# Altium footprint library ref-packages-longpad.PCBLIB: 1527 footprints (part 68 of 103)
Each footprint in its own frame and in the unit in brackets; x right, y up, seen from the top. Pads: shape width x height; smd on the part's side, far side on the other; paste and mask are expansions set on the pad; w line width, h text height; cw(c..) or ccw(c..) is an arc to the next point about the centre after c.
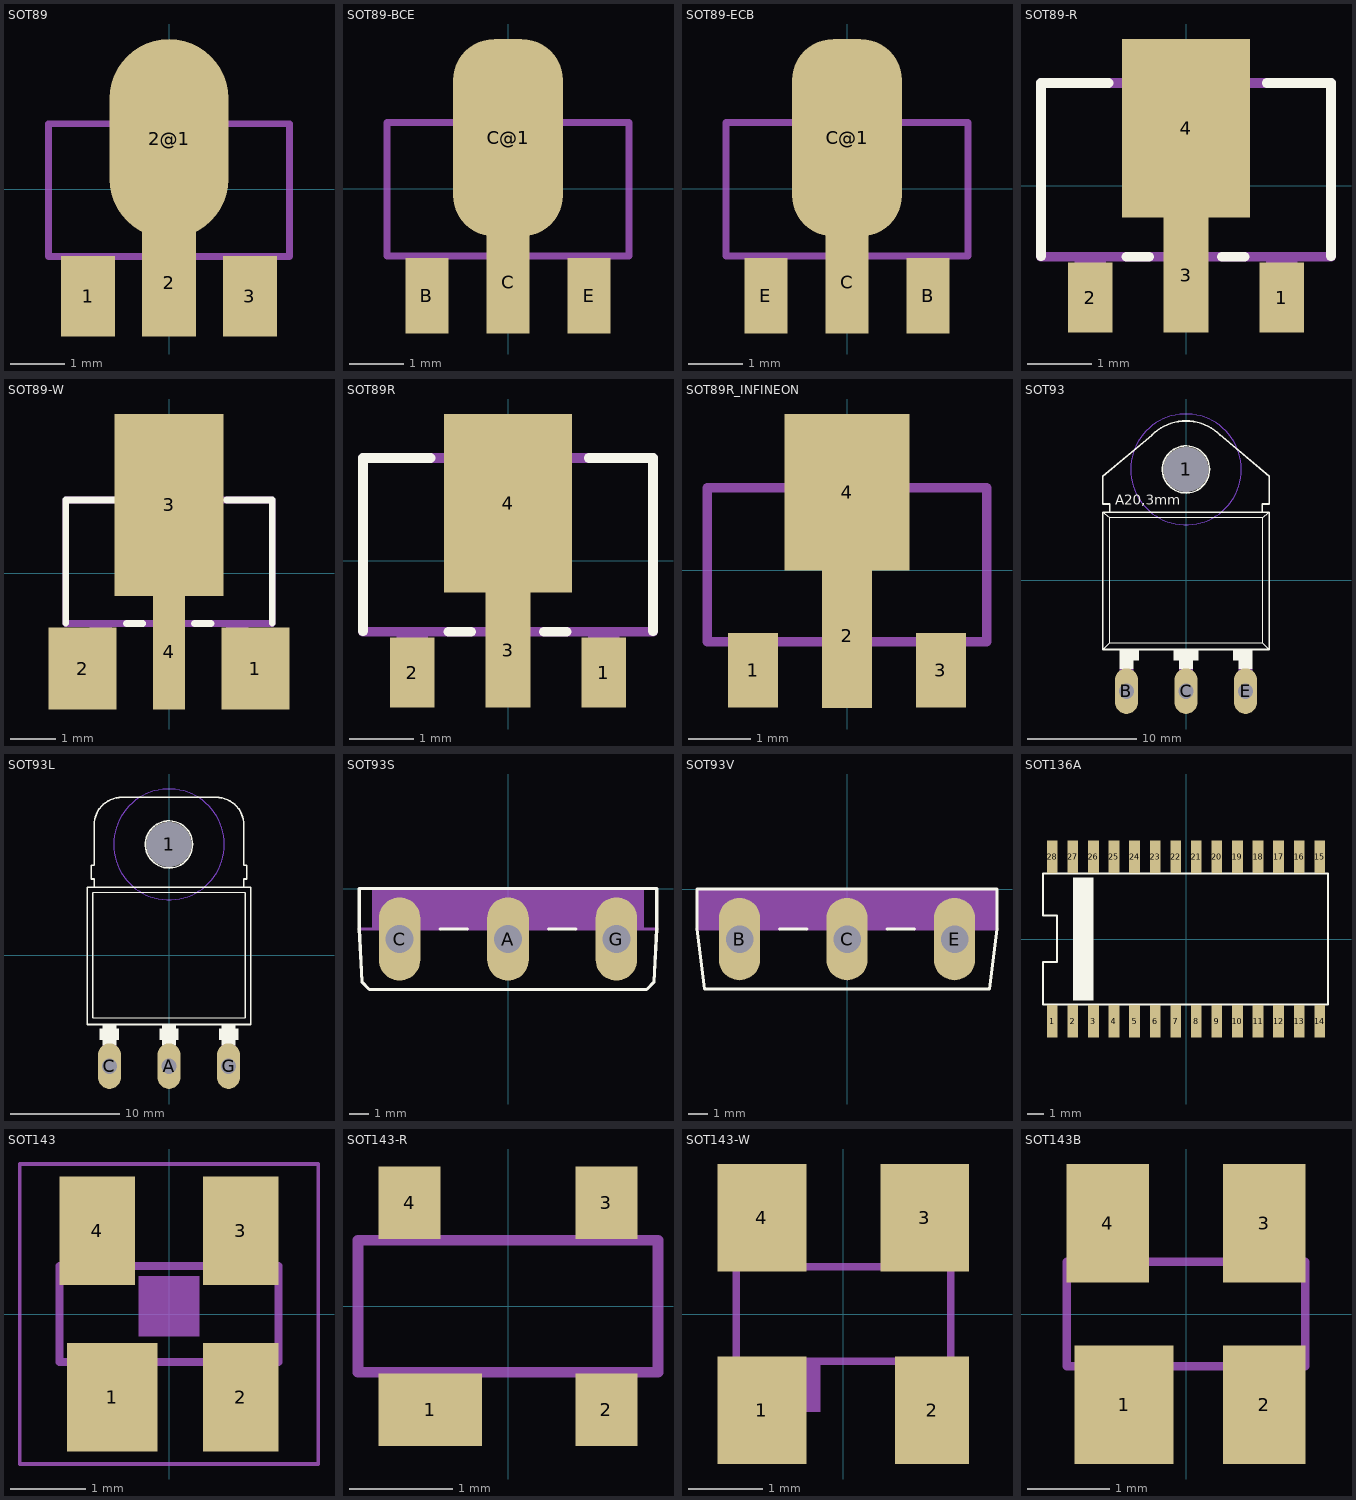
[diagram p67: the footprints below, top view; thin cyan lines are the x and y axes]

## SOT89 [mm]
pads (4):
  rect 1x1.5 smd: 1(-1.499,-1.981) 3(1.499,-1.981)
  rect 1x2 smd: 2(0,-1.727)
  rrect100% 2.2x3.7 smd: 2@1(0,0.94)
Top Paste:
  rectangle: -0.4,-2.68 0.4,-1.28
  rectangle: 1.1,-2.68 1.9,-1.28
  rectangle: -1.9,-2.68 -1.1,-1.28
Top Solder:
  rectangle: -2.025,-2.775 -0.975,-1.2
  rectangle: 0.975,-2.775 2.025,-1.2
  rectangle: -0.525,-2.775 0.525,-1.2
Mechanical 16:
  rectangle: -1.727,-2.108 -1.27,-1.27
  rectangle: 1.27,-2.108 1.727,-1.27
  rectangle: -0.279,-2.108 0.279,-1.27
  region: 0,0 0.254,0 0.254,0.254 0,0.254
  lines w0.127: -2.235,-1.245 2.235,-1.245 2.235,1.219 -2.235,1.219 -2.235,-1.245
  lines w0.2: -0.787,1.295 0.787,1.295 0.787,1.575 0.356,2.007 -0.356,2.007 -0.787,1.575 -0.787,1.295

## SOT89-BCE [mil]
pads (4):
  rect 31.5x55.12 smd: B(-59.02,-77.99) E(59.02,-77.99)
  rect 31.5x74.8 smd: C(0,-67.99)
  rrect75% 80x143.7 smd: C@1(0,37.01)
Top Paste:
  rectangle: -15.75,-105.51 15.75,-50.39
Top Solder:
  rectangle: -19.69,-109.45 19.69,-46.46
Mechanical 16:
  rectangle: -68,-83 -50,-50
  rectangle: 50,-83 68,-50
  rectangle: -11,-83 11,-50
  region: 0,0 10,0 10,10 0,10
  lines w5: -87.99,-49.02 87.99,-49.02 87.99,47.99 -87.99,47.99 -87.99,-49.02
  lines w7.87: -31,51 31,51 31,62 14,79 -14,79 -31,62 -31,51

## SOT89-ECB [mil]
pads (4):
  rect 31.5x55.12 smd: B(59.02,-77.99) E(-59.02,-77.99)
  rect 31.5x74.8 smd: C(0,-67.99)
  rrect75% 80x143.7 smd: C@1(0,37.01)
Top Paste:
  rectangle: -15.75,-105.51 15.75,-50.39
Top Solder:
  rectangle: -19.69,-109.45 19.69,-46.46
Mechanical 16:
  rectangle: -68,-83 -50,-50
  rectangle: 50,-83 68,-50
  rectangle: -11,-83 11,-50
  region: 0,0 10,0 10,10 0,10
  lines w5: -87.99,-49.02 87.99,-49.02 87.99,47.99 -87.99,47.99 -87.99,-49.02
  lines w7.87: -31,51 31,51 31,62 14,79 -14,79 -31,62 -31,51

## SOT89-R [mm]
pads (4):
  rect 0.7x1.1 smd: 1(1.5,-1.75) 2(-1.5,-1.75)
  rect 0.7x1.8 smd: 3(0,-1.4)
  rect 2x2.8 smd: 4(0,0.9)
Top Overlay:
  lines w0.152: -2.272,-1.102 -2.272,1.61 -1.214,1.61 ; -0.936,-1.11 -0.578,-1.11 ; 0.564,-1.11 0.923,-1.11 ; 1.264,1.61 2.272,1.61 2.272,-1.102
Top Paste:
  rectangle: -0.35,-2.3 0.35,-1.2
Top Solder:
  rectangle: -0.45,-2.4 0.45,-1.1
Mechanical 16:
  rectangle: -1.75,-2.15 -1.25,-1.15
  rectangle: -0.25,-2.15 0.25,-1.15
  rectangle: 1.25,-2.15 1.75,-1.15
  rectangle: -0.85,1.65 0.85,2.2
  lines w0.152: -2.272,-1.11 2.272,-1.11 2.272,1.61 -2.272,1.61 -2.272,-1.11

## SOT89-W [mm]
pads (4):
  rect 1.5x1.8 smd: 1(1.9,-2.1) 2(-1.9,-2.1)
  rect 2.4x4 smd: 3(0,1.5)
  rect 0.7x2.55 smd: 4(0,-1.73)
Top Overlay:
  lines w0.152: -2.272,-1.102 -2.272,1.61 -1.214,1.61 ; -0.936,-1.11 -0.578,-1.11 ; 0.564,-1.11 0.923,-1.11 ; 1.264,1.61 2.272,1.61 2.272,-1.102
Top Paste:
  rectangle: -0.35,-3 0.35,-1.2
Top Solder:
  rectangle: -0.45,-3.1 0.45,-1.1
Mechanical 16:
  rectangle: -1.75,-2.15 -1.25,-1.15
  rectangle: -0.25,-2.15 0.25,-1.15
  rectangle: 1.25,-2.15 1.75,-1.15
  rectangle: -0.85,1.65 0.85,2.2
  lines w0.152: -2.272,-1.11 2.272,-1.11 2.272,1.61 -2.272,1.61 -2.272,-1.11

## SOT89R [mm]
pads (4):
  rect 0.7x1.1 smd: 1(1.5,-1.75) 2(-1.5,-1.75)
  rect 0.7x1.8 smd: 3(0,-1.4)
  rect 2x2.8 smd: 4(0,0.9)
Top Overlay:
  lines w0.152: -2.272,-1.102 -2.272,1.61 -1.214,1.61 ; -0.936,-1.11 -0.578,-1.11 ; 0.564,-1.11 0.923,-1.11 ; 1.264,1.61 2.272,1.61 2.272,-1.102
Top Paste:
  rectangle: -0.35,-2.3 0.35,-1.2
Top Solder:
  rectangle: -0.45,-2.4 0.45,-1.1
Mechanical 16:
  rectangle: -1.75,-2.15 -1.25,-1.15
  rectangle: -0.25,-2.15 0.25,-1.15
  rectangle: 1.25,-2.15 1.75,-1.15
  rectangle: -0.85,1.65 0.85,2.2
  lines w0.152: -2.272,-1.11 2.272,-1.11 2.272,1.61 -2.272,1.61 -2.272,-1.11

## SOT89R_INFINEON [mil]
pads (4):
  rect 31.5x47.24 smd: 1(-59.06,-62.99) 3(59.06,-62.99)
  rect 31.5x90.55 smd: 2(0,-41.34)
  rect 78.74x98.43 smd: 4(0,49.21)
Top Paste:
  rectangle: -15.75,-86.61 15.75,-39.37
Top Solder:
  rectangle: -19.69,-90.55 19.69,-35.43
Mechanical 16:
  rectangle: -68,-79.06 -50,-46.06
  rectangle: 50,-79.06 68,-46.06
  rectangle: -11,-79.06 11,-46.06
  region: 0,0 10,0 10,10 0,10
  lines w6: -87.99,-45.08 87.99,-45.08 87.99,51.93 -87.99,51.93 -87.99,-45.08
  lines w8: -31,54.94 31,54.94 31,65.94 14,82.94 -14,82.94 -31,65.94 -31,54.94

## SOT93 [mil]
pads (4):
  round 162 hole 162: 1(0,400)
  oval 82.5x165 hole 55: B(-215,-400) C(0,-400) E(215,-400)
Bottom Layer keep-out:
  circle w0: c0,400 r200
Top Overlay:
  circle w6: c0,400 r85
  rectangle: -240,-290 -170,-250
  rectangle: 170,-290 240,-250
  rectangle: -45,-290 45,-250
  rectangle: -240,-320 -190,-250
  rectangle: -25,-320 25,-250
  rectangle: 190,-320 240,-250
  lines w2: -300,-250 -275,-225 ; -300,245.08 -275,225 ; 300,-250 275,-225 ; 300,245.08 275,225 ; -275,-225 275,-225 ; -275,-225 -275,225 ; -275,225 275,225 ; 275,-225 275,225
  lines w6: -123.74,523.74 cw(c0.01,400) 0,575 cw(c-0.01,400) 123.74,523.74 ; -123,524 -300,375 -300,275 -275,275 -275,245 ; 123,525 300,375 300,275 275,275 275,245 ; -275,245 -300,245 -300,-250 300,-250 300,245 275,245 ; -275,245 275,245
  text "A20,3mm" at -255,260 h62
Mechanical 16:
  rectangle: -240,-405 -190,-320
  rectangle: -25,-405 25,-320
  rectangle: 190,-405 240,-320
Via Holes:
  circle w0: c0,400 r200

## SOT93L [mil]
pads (4):
  round 162 hole 162: 1(0,400)
  oval 82.5x165 hole 55: A(0,-400) C(-215,-400) G(215,-400)
Bottom Layer keep-out:
  circle w0: c0,400 r200
Top Overlay:
  circle w6: c0,400 r85
  rectangle: -250,-305 -180,-265
  rectangle: 180,-305 250,-265
  rectangle: -240,-325 -190,-250
  rectangle: -25,-325 25,-250
  rectangle: 190,-325 240,-250
  rectangle: -35,-305 35,-265
  lines w2: -275,-225 275,-225 ; -275,225 275,225
  lines w6: -275,-225 -275,225 ; 275,-225 275,225 ; -270,245 -270,275 -280,275 -280,325 -270,325 -270,470 cw(c-170,470) -170,570 170,570 cw(c170,470) 270,470 270,325 280,325 280,275 270,275 270,245 ; -270,245 -295,245 -295,-250 295,-250 295,245 270,245 ; -270,245 270,245
Mechanical 16:
  rectangle: -240,-385 -190,-350
  rectangle: -240,-400 -190,-325
  rectangle: -25,-400 25,-325
  rectangle: 190,-400 240,-325
Via Holes:
  circle w0: c0,400 r200

## SOT93S [mil]
pads (3):
  oval 82.5x165 hole 55: A(0,-100) C(-215,-100) G(215,-100)
Top Overlay:
  lines w6: -135,-80 -80,-80 ; 80,-80 135,-80 ; -295,-80 -295,0 295,0 295,-80 290,-185 275,-200 -275,-200 -290,-185 -295,-80
Mechanical 16:
  rectangle: -270,-80 270,0
  lines w6: -295,-80 -135,-80 ; -80,-80 80,-80 ; 135,-80 295,-80

## SOT93V [mil]
pads (3):
  oval 82.5x165 hole 55: B(-215,-100) C(0,-100) E(215,-100)
Top Overlay:
  lines w6: -135,-80 -80,-80 ; 80,-80 135,-80 ; -300,-80 -300,0 300,0 300,-80 285,-200 -285,-200 -300,-80
Mechanical 16:
  rectangle: -300,-80 300,0
  lines w6: -300,-80 -135,-80 ; -80,-80 80,-80 ; 135,-80 300,-80

## SOT136A [mil]
pads (28):
  rect 26x79 smd: 1(-325,-200) 2(-275,-200) 3(-225,-200) 4(-175,-200) 5(-125,-200) 6(-75,-200) 7(-25,-200) 8(25,-200) 9(75,-200) 10(125,-200) 11(175,-200) 12(225,-200) 13(275,-200) 14(325,-200) 15(325,200) 16(275,200) 17(225,200) 18(175,200) 19(125,200) 20(75,200) 21(25,200) 22(-25,200) 23(-75,200) 24(-125,200) 25(-175,200) 26(-225,200) 27(-275,200) 28(-325,200)
Top Overlay:
  rectangle: -335,-220 -315,-160
  rectangle: -285,-220 -265,-160
  rectangle: -235,-220 -215,-160
  rectangle: -185,-220 -165,-160
  rectangle: -135,-220 -115,-160
  rectangle: -85,-220 -65,-160
  rectangle: -35,-220 -15,-160
  rectangle: 15,-220 35,-160
  rectangle: 65,-220 85,-160
  rectangle: 115,-220 135,-160
  rectangle: 165,-220 185,-160
  rectangle: 215,-220 235,-160
  rectangle: 265,-220 285,-160
  rectangle: 315,-220 335,-160
  rectangle: 315,160 335,220
  rectangle: 265,160 285,220
  rectangle: 215,160 235,220
  rectangle: 165,160 185,220
  rectangle: 115,160 135,220
  rectangle: 65,160 85,220
  rectangle: 15,160 35,220
  rectangle: -35,160 -15,220
  rectangle: -85,160 -65,220
  rectangle: -135,160 -115,220
  rectangle: -185,160 -165,220
  rectangle: -235,160 -215,220
  rectangle: -285,160 -265,220
  rectangle: -335,160 -315,220
  rectangle: -275,-150 -225,150
  lines w5: -347,-159 345,-159 345,159 -347,159 -347,57 -313,57 -313,-56 -347,-56 -347,-159

## SOT143 [mm]
pads (4):
  rect 1.2x1.44 smd: 1(-0.75,-1.1)
  rect 1x1.44 smd: 2(0.95,-1.1) 3(0.95,1.1) 4(-0.95,1.1)
Mechanical 6:
  rectangle: -0.4,-0.3 0.4,0.5
Mechanical 16:
  rectangle: 0.737,-1.321 1.194,-0.635
  rectangle: 0.711,0.635 1.168,1.321
  rectangle: -1.143,0.635 -0.686,1.321
  rectangle: -1.194,-1.321 -0.305,-0.635
  lines w0.102: -1.448,-0.635 1.448,-0.635 1.448,0.635 -1.448,0.635 -1.448,-0.635
Mechanical 27:
  lines w0.051: -1.973,-1.983 1.973,-1.983 1.973,1.983 -1.973,1.983 -1.973,-1.983

## SOT143-R [mm]
pads (4):
  rect 1x0.7 smd: 1(-0.75,-1)
  rect 0.6x0.7 smd: 2(0.95,-1) 3(0.95,1) 4(-0.95,1)
Mechanical 16:
  rectangle: 0.737,-1.321 1.194,-0.635
  rectangle: 0.711,0.635 1.168,1.321
  rectangle: -1.143,0.635 -0.686,1.321
  rectangle: -1.194,-1.321 -0.305,-0.635
  lines w0.102: -1.448,-0.635 1.448,-0.635 1.448,0.635 -1.448,0.635 -1.448,-0.635

## SOT143-W [mm]
pads (4):
  rect 1.2x1.45 smd: 1(-1.1,-1.3) 3(1.1,1.3) 4(-1.1,1.3)
  rect 1x1.45 smd: 2(1.2,-1.3)
Mechanical 16:
  rectangle: 0.737,-1.321 1.194,-0.635
  rectangle: 0.711,0.635 1.168,1.321
  rectangle: -1.143,0.635 -0.686,1.321
  rectangle: -1.194,-1.321 -0.305,-0.635
  lines w0.102: -1.448,-0.635 1.448,-0.635 1.448,0.635 -1.448,0.635 -1.448,-0.635

## SOT143B [mm]
pads (4):
  rect 1.2x1.44 smd: 1(-0.75,-1.1)
  rect 1x1.44 smd: 2(0.95,-1.1) 3(0.95,1.1) 4(-0.95,1.1)
Mechanical 16:
  rectangle: 0.737,-1.321 1.194,-0.635
  rectangle: 0.711,0.635 1.168,1.321
  rectangle: -1.143,0.635 -0.686,1.321
  rectangle: -1.194,-1.321 -0.305,-0.635
  lines w0.102: -1.448,-0.635 1.448,-0.635 1.448,0.635 -1.448,0.635 -1.448,-0.635